# Altium integrated library OMID_DXP_LIB93.IntLib: 684 symbols (part 4 of 5) (continued)
## OPTOCOPLER-4
designator O?, comment OPTO
footprint DIP-16 (DIP; 16 Leads; Row Spacing 7.62 mm; Pitch 2.54 mm)
pins: 1 A "Anode", 2 K "Cathode", 3 A "Anode", 4 K "Cathode", 5 A "Anode", 6 K "Cathode", 7 A "Anode", 8 K "Cathode", 9 E "Emitter", 10 C "Collector", 11 E "Emitter", 12 C "Collector", 13 E "Emitter", 14 C "Collector", 15 E "Emitter", 16 C "Collector"

## Optoisolator
designator U?, comment OPT  (value not drawn)
Optoisolator
footprint My_opto
footprint my_opto_smd
pins: 1 A, 2 K, 3 C, 4 E

## Optoisolator2
designator U?
5 Pin Mini Flat Pack Optocoupler; Published: 24-Mar-1999; LatestRevisionDate: 04-Mar-2005; LatestRevisionNote: PCB Footprint replaced, Sch pins re-numbered.; DatasheetVersion: Apr-2004; PackageReference: SOP5(6); Publisher: Altium Limited
footprint DIP-6 (DIP; 6 Leads; Row Spacing 7.62 mm; Pitch 2.54 mm)
footprint 4N37
pins: 1 A "Anode", 2 K "Cathode", 4 E "Emitter", 5 C "Collector", 6 B "Base"

## PAM8403
designator *
footprint SO-16 (SOIC, 16-Leads, Body 9.9x3.9mm, Pitch 1.27mm, IPC Medium Density)
pins: 1 +L (out), 2 GND (power), 3 -L (out), 4 PWR (power), 5 ~{MUTE} (in), 6 PWR (power), 7 INL (in), 8 Vref (in), 9 GND (power), 10 INR (in), 11 GND (power), 12 ~{SHDN} (in), 13 PWR (power), 14 -R (out), 15 GND (power), 16 +R (out)

## PARS-IR
designator IR?
footprint my_pars
pins: 1 GND, 2 VCC, 3 OUT
text: PARS; +5; Out

## PCA82C250
designator U?
CAN controller interface
footprint My_8S2_M
3D model 8S2 (PCB3D Model)
pins: 1 TXD (in), 2 GND (power), 3 VCC (power), 4 RXD (out), 5 Vref (out), 6 CANL (io), 7 CANH (io), 8 RS (in)

## Peak/Plcae
designator U?, comment Peak Location
peak and place refrence location to place component's; Manufacturer: ---; Class: peak&place; SubClass: smd; Published: 24/08/2015; Publisher: Omid Habibi; Series: assembele
footprint peak&Place
text: Peak/Place Locaion

## PGA2310
designator U?, comment DIGITAL POT
Stereo Audio Volume Control
footprint DIP16
footprint my_smd 16
pins: 1 ZCEN, 2 ~{CS}, 3 SDI, 4 VCC(5) (power), 5 D GND (power), 6 SCLK, 7 SDO, 8 ~{MUTE} (in), 9 VIN R (in), 10 GND R, 11 Vout R (out), 12 A VCC(+15) (power), 13 A GND(-15) (power), 14 Vout L (out), 15 GND L, 16 VIN L (in)

## PIC12F629
designator U?
Flash-Based 8-Bit CMOS Microcontroller, 1K (x14-Bit words) Program Memory, 192 Bytes Data Memory, 8-Pin DFN, Extended Temperature; Published: 29-Jan-2009; DatasheetVersion: revE, Mar-2007; PackageVersion: revAW, Oct-2008; PackageReference: DFN-MD8; Publisher: Altium Limited; PackageDescription: 8-Lead Plastic Dual Flat, No Lead Package (MD) - 4x4x0.9mm Body [DFN]; ComponentLink1Description: Manufacturer Link; ComponentLink1URL: http://www.microchip.com; ComponentLink2Description: Datasheet; ComponentLink2URL: http://ww1.microchip.com/downloads/en/DeviceDoc/41190E.pdf; ComponentLink3Description: Packaging Specification; ComponentLink3URL: http://ww1.microchip.com/downloads/en/PackagingSpec/00049AW.pdf
footprint SO8_NARROW_L (8-Pin Small Outline Package (SO8), IPC High Density)
footprint DIP8
pins: 1 VDD (power), 2 GP5/OSC1/CLKIN (io), 3 GP4/OSC2 (io), 4 GP3/~{MCLR}/VPP (io), 5 GP2/T0CKI (io), 6 GP1/ICSPCLK (io), 7 GP0/ICSPDAT (io), 8 VSS (power)

## PIC16F84A-04/SO
designator U?
Enhanced FLASH/EEPROM 8-Bit Microcontroller, 1K (x14-Bit words) FLASH, 68 Bytes RAM, 4 MHz, 18-Pin SOIC, Standard VDD Range, Commercial Temperature; Note: 25mA source and sink per I/O.; Published: 11-Oct-2004; LatestRevisionDate: 29-Jan-2009; LatestRevisionNote: Sch. layout revised. 3D Model Removed.; DatasheetVersion: revB, Aug-2001; PackageVersion: revAW, Oct-2008; PackageReference: SOIC-SO18; Publisher: Altium Limited; PackageDescription: 18-Lead Plastic Small Outline (SO) - Wide 7.50mm Body [SOIC]; Code_JEDEC: MS-013; ComponentLink1Description: Manufacturer Link; ComponentLink1URL: http://www.microchip.com; ComponentLink2Description: Datasheet; ComponentLink2URL: http://ww1.microchip.com/downloads/en/DeviceDoc/35007b.pdf; ComponentLink3Description: Packaging Specification; ComponentLink3URL: http://ww1.microchip.com/downloads/en/PackagingSpec/00049AW.pdf
footprint SOIC-SO18_N (SOIC, 18-Leads, Body 11.5x7.5mm, Pitch 1.27mm, IPC Medium Density)
footprint SOIC-SO18_L (SOIC, 18-Leads, Body 11.5x7.5mm, Pitch 1.27mm, IPC High Density)
footprint SOIC-SO18_M (SOIC, 18-Leads, Body 11.5x7.5mm, Pitch 1.27mm, IPC Low Density)
pins: 1 RA2 (io), 2 RA3 (io), 3 RA4/T0CKI (io), 4 ~{MCLR} (in), 5 VSS (power), 6 RB0/INT (io), 7 RB1 (io), 8 RB2 (io), 9 RB3 (io), 10 RB4 (io), 11 RB5 (io), 12 RB6 (io), 13 RB7 (io), 14 VDD (power), 15 OSC2/CLKOUT (out), 16 OSC1/CLKIN (in), 17 RA0 (io), 18 RA1 (io)

## PL2303
designator U?
USB to Serial Bridge Controller
footprint SSOP-28
pins: 1 TXD, 2 DTR-N, 3 RTS-N, 4 VDD-232, 5 RXD, 6 RI-N, 7 GND, 8 VDD, 9 DSR-N, 10 DCD-N, 11 CTS-N, 12 SHTD-N, 13 EE-CLK, 14 EE-DATA, 15 DP, 16 DM, 17 VDD-3V3, 18 GND-3V3, 19 RESET, 20 VDD, 21 GND, 22 TRI-MODE, 23 LD-MODE, 24 VDD-PLL, 25 GND-PLL, 26 PLL-TEST, 27 OSC1, 28 OSC2

## PS2501
designator U?, comment OPT  (value not drawn)
Optoisolator
footprint My_opto
footprint my_opto_smd
pins: 1 A, 2 K, 3 E, 4 C

## PT2256 VOLUME DIGITAL
designator U?, comment VOL
Electronic Volume Controller IC(4.5~12V)
footprint DIP-16 (DIP; 16 Leads; Row Spacing 7.62 mm; Pitch 2.54 mm)
pins: 1 GND (power), 2 OUT1, 3 IN1, 4 LT1, 5 AGND, 6 UP (in), 7 DWN (in), 8 OSC, 9 RST, 10 INH, 11 DCO, 12 AGND, 13 LT2, 14 IN2, 15 OUT2, 16 VCC (power)

## RCV420
designator U?
Precision 4mA to 20mA  CURRENT LOOP RECEIVER
footprint DIP-16 (DIP; 16 Leads; Row Spacing 7.62 mm; Pitch 2.54 mm)
pins: 1 -IN, 2 Ct, 3 +IN, 4 V-, 5 REF com, 6 NC, 7 Ref Noise RedU, 8 Ref Trim, 9 NC, 10 REF Fb, 11 REF Out, 12 REF In, 13 Rcv Com, 14 Rcv Out, 15 Rcv Fb, 16 V+

## REF02AZ
designator U?  (value not drawn)
+5V Precision Voltage Reference/Temperature Transducer; Note: Pins 1, 7 and 8 are not connected; Pin 4 is connected to case; Published: 8-Jun-2000; LatestRevisionDate: 29-May-2009; LatestRevisionNote: Component Body Added.; DatasheetVersion: REV. B 1992; PackageVersion: 1998; PackageReference: Q-8; Publisher: Altium Limited; PackageDescription: DIP, 8-Pin, Row Spacing 7.62 mm, Pitch 2.54 mm; ComponentLink1Description: Manufacturer Link; ComponentLink1URL: http://www.analog.com/en/prod/0%2C2877%2CREF02%2C00.html; ComponentLink2Description: Datasheet; ComponentLink2URL: http://www.analog.com/UploadedFiles/Data_Sheets/499818767ref02_h.pdf
footprint Q-8 (DIP, 8-Leads, Row Spacing 7.62mm, Pitch 2.54mm, Body 9.91x6.73mm)
3D model Q-8 (PCB3D Model)
simulation model REF02A (SUBCKT)
pins: 1 NC, 2 IN (power), 3 TEMP, 4 GND (power), 5 TRIM, 6 OUT (power), 7 NC, 8 NC

## REF3333
designator U?
3.9µA, SOT23 30ppm/°C Drift  VOLTAGE REFERENCE
footprint SOT23_L (SOT23, 3-Leads, Body 2.9x1.3mm, Pitch 0.95mm, Lead Span 2.3mm, IPC High Density)
footprint SOT23_M (SOT23, 3-Leads, Body 2.9x1.3mm, Pitch 0.95mm, Lead Span 2.3mm, IPC Low Density)
footprint SOT23_N (SOT23, 3-Leads, Body 2.9x1.3mm, Pitch 0.95mm, Lead Span 2.3mm, IPC Medium Density)
pins: 1 IN (power), 2 OUT (power), 3 GND

## RF01D
designator RF?
READER RFID MODULE
footprint MY_rf01d
pins: 1 vcc, 2 CLK, 3 TX, 4 CP, 5 NC, 6 SW2, 7 SW3, 8 NC, 9 LED, 10 GND, 11, 12
text: ANT

## RFID RC013
designator IC?, comment CR013
READ AND WRITE RFID MODULE
footprint CR0 13
pins: 1 VCC (in), 2 GND (in), 3 LED1 (out), 4 TX2 (oc), 5 TX1 (oc), 6 RX (oc), 7 GND (oc), 8 LED2 (out), 9 TXD (oc), 10 RXD (oc)
text: RFID CR013

## RFID YLMF18
designator RFID?, comment RFID
READ AND WRITE RFID MODULE
footprint YLMF18
pins: 3 VCC (in), 4 GND (in), 5 RXD (in), 6 TXD (out), 7 VCC (in)

## RFM12
designator RF?  (value not drawn)
Universal ISM Band FSK Transceiver Module
footprint RFM12SMD
footprint RFM12
pins: 1 VDI, 2 SDI, 3 nSEL, 4 nIRQ, 5 DCLK, 6 nRES, 7 GND (in), 8 CLK (in), 9 FSK (in), 10 SDO (in), 11 SCK (in), 12 VDD (in)

## RFM12BP
designator RFM12BP?
footprint RFM12BP
pins: 1 GND, 2 GND, 3 PWR 12V, 4 GND, 5 SDI, 6 SCK, 7 nSEL, 8 SDO, 9 nIRQ, 10 FSK, 11 FIT, 12 CLK, 13 ANT, 14 GND, 15 GND, 16 RXEN, 17 GND, 18 TXEN, 19 GND, 20 3.3 V, 21 GND, 22 nINT, 23 GND, 24 nRES

## RTL8201BL
designator U?
SINGLE PORT 10/100M  FAST ETHERNET PHYCEIVER
footprint MY_LQFP48 (TSQFP, 48-Leads, Body 9.0x9.0mm (max), Pitch 0.50mm, IPC Medium Density)
3D model AT90C8534-48A (PCB3D Model)
pins: 1 COL (out), 2 TXEN (in), 3 TXD3 (in), 4 TXD2 (in), 5 TXD1 (in), 6 TXD0 (in), 7 TXC (out), 8 PWFBIN (in), 9 LED0/AD0 (out), 10 LED1/AD1 (out), 11 DGND (power), 12 LED2/AD2 (out), 13 LED3/AD3 (out), 14 DVDD33 (power), 15 LED4/AD4 (out), 16 RXC (out), 17 DGND (power), 18 RXD3 (out), 19 RXD2 (out), 20 RXD1 (out), 21 RXD0 (out), 22 RXDV (out), 23 CRS (out), 24 RXER/FXEN (out), 25 MDC (in), 26 MDIO (io), 27 NC (power), 28 RTSET (in), 29 AGND (power), 30 TPRX- (in), 31 TPRX+ (in), 32 PWFBOUT (in), 33 TPTX- (out), 34 TPTX+ (out), 35 AGND (power), 36 AVDD33 (power), 37 ANE (power), 38 DUPLEX (power), 39 SPEED (power), 40 RPTR (in), 41 LDPS (in), 42 RESETB (in), 43 ISOLATE (in), 44 MII/SNIB/RTT3 (io), 45 DGND (power), 46 X1, 47 X2, 48 DVDD33 (power)

## SC43L22
designator U?
Low Power, Stereo DAC w/Headphone & Speaker Amps; by: Omid habibi; make:: 18/3/4
footprint QFN40 (QFN, 40-Leads, Body 6x6mm, No Lead,)
pins: 1 SDA, 2 SCL, 3 A0, 4 SPKR_OUTA+ (out), 5 VP, 6 SPKR_OUTA- (out), 7 SPKR_OUTB+ (out), 8 VP, 9 SPKR_OUTB- (out), 10 -VHPFILT, 11 FLYN, 12 FLYP, 13 +VHP, 14 HP /LINE_OUTB (out), 15 HP /LINE_OUTA (out), 16 VA, 17 AGND, 18 FILT+, 19 VQ, 20 TSTO, 21 AIN4A (in), 22 AIN4B (in), 23 AIN3A (in), 24 AIN3B (in), 25 AIN2A (in), 26 AIN2B (in), 27 AFILTA, 28 AFILTB, 29 AIN1A (in), 30 AIN1B (in), 31 SPKR/HP, 32 ~{RESET}, 33 VL (power), 34 VD, 35 DGND (power), 36 TSTO, 37 MCLK, 38 SCLK, 39 SDIN, 40 LRCK

## SHT1X
designator U?  (value not drawn)
Photo Modules for PCM Remote Control Systems; Designer: Omid Habibi; Company: SensIron; Voltage: 2.4v~5.5V; Power: 3 mW; Adding Date: 1394/09/26
footprint SHT1X
pins: 1 GND (power), 2 Data (io), 3 sck (in), 4 2.4~5.5(3.3) (power)

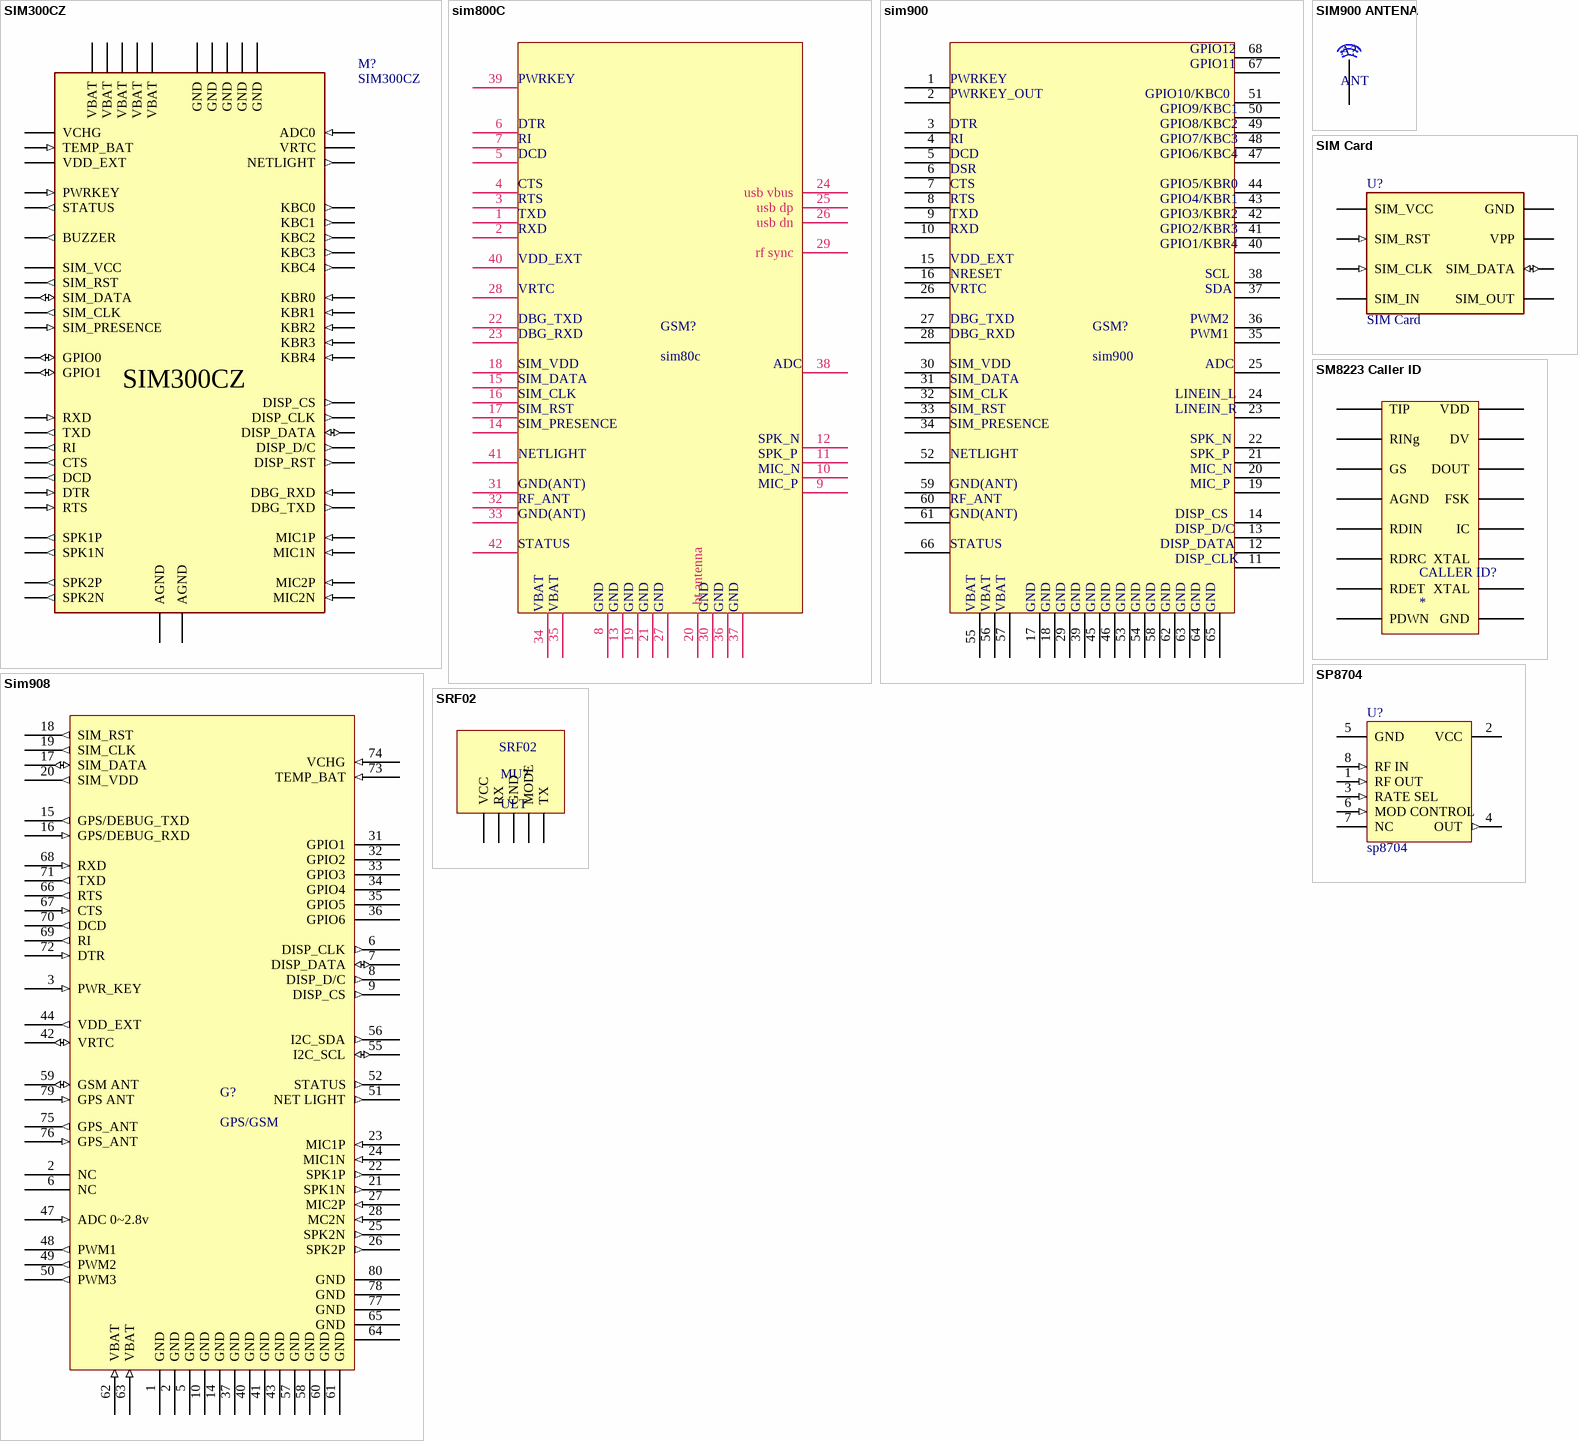
[diagram p24: symbols SIM300CZ to SRF02]

## SIM300CZ
designator M?
footprint MY_SIM300
pins: 1 VBAT (power), 2 GND (power), 3 VBAT (power), 4 GND (power), 5 VBAT (power), 6 GND (power), 7 VBAT (power), 8 GND (power), 9 VBAT (power), 10 GND (power), 11 VCHG (power), 12 ADC0 (in), 13 TEMP_BAT (in), 14 VRTC, 15 VDD_EXT, 16 NETLIGHT (out), 17 PWRKEY (in), 18 KBC0 (out), 19 STATUS (out), 20 KBC1 (out), 21 GPIO0 (io), 22 KBC2 (out), 23 BUZZER (out), 24 KBC3 (out), 25 SIM_VCC (power), 26 KBC4 (out), 27 SIM_RST (out), 28 KBR0 (in), 29 SIM_DATA (io), 30 KBR1 (in), 31 SIM_CLK (out), 32 KBR2 (in), 33 SIM_PRESENCE (in), 34 KBR3 (in), 35 GPIO1 (io), 36 KBR4 (in), 37 DCD (out), 38 DISP_CS (out), 39 DTR (in), 40 DISP_CLK (out), 41 RXD (in), 42 DISP_DATA (io), 43 TXD (out), 44 DISP_D/C (out), 45 RTS (in), 46 DISP_RST (out), 47 CTS (out), 48 DBG_RXD (in), 49 RI (out), 50 DBG_TXD (out), 51 AGND (power), 52 AGND (power), 53 SPK1P (out), 54 MIC1P (in), 55 SPK1N (out), 56 MIC1N (in), 57 SPK2P (out), 58 MIC2P (in), 59 SPK2N (out), 60 MIC2N (in)

## sim800C
designator GSM?, comment sim80c
GSM GPRS MODULE
footprint sim800C
pins: 1, 2, 3, 4, 5, 6, 7, 8, 9, 10, 11, 12, 13, 14, 15, 16, 17, 18, 19, 20 bt antenna, 21, 22, 23, 24 usb vbus, 25 usb dp, 26 usb dn, 27, 28, 29 rf sync, 30, 31, 32, 33, 34, 35, 36, 37, 38, 39, 40, 41, 42
text: PWRKEY; DTR; RI; DCD; CTS; RTS; TXD; RXD; VDD_EXT; VRTC; DBG_TXD; DBG_RXD; SIM_VDD; ADC; SIM_DATA; SIM_CLK; SIM_RST; SIM_PRESENCE; SPK_N; NETLIGHT; SPK_P; MIC_N; GND(ANT); MIC_P; RF_ANT; STATUS; VBAT; GND

## sim900
designator GSM?
GSM GPRS MODULE
footprint sim900
pins: 1, 2, 3, 4, 5, 6, 7, 8, 9, 10, 11, 12, 13, 14, 15, 16, 17, 18, 19, 20, 21, 22, 23, 24, 25, 26, 27, 28, 29, 30, 31, 32, 33, 34, 35, 36, 37, 38, 39, 40, 41, 42, 43, 44, 45, 46, 47, 48, 49, 50, 51, 52, 53, 54, 55, 56, 57, 58, 59, 60, 61, 62, 63, 64, 65, 66, 67, 68
text: GPIO12; GPIO11; PWRKEY; PWRKEY_OUT; GPIO10/KBC0; GPIO9/KBC1; DTR; GPIO8/KBC2; RI; GPIO7/KBC3; DCD; GPIO6/KBC4; DSR; CTS; GPIO5/KBR0; RTS; GPIO4/KBR1; TXD; GPIO3/KBR2; RXD; GPIO2/KBR3; GPIO1/KBR4; VDD_EXT; NRESET; SCL; VRTC; SDA; DBG_TXD; PWM2; DBG_RXD; PWM1; SIM_VDD; ADC; SIM_DATA; SIM_CLK; LINEIN_L; SIM_RST; LINEIN_R; SIM_PRESENCE; SPK_N; NETLIGHT; SPK_P; MIC_N; GND(ANT); MIC_P; RF_ANT; DISP_CS; DISP_D/C; STATUS; DISP_DATA; DISP_CLK; VBAT; GND

## SIM900 ANTENA
designator A?, comment ANT
SIM900 ANTENA ON PCB
footprint sim900 antena
pins: 0

## Sim908
designator G?, comment GPS/GSM
GPS GSM MODULE
footprint sim908
pins: 1 GND, 2 NC, 2 GND, 3 PWR_KEY (in), 5 GND, 6 NC, 6 DISP_CLK (out), 7 DISP_DATA (io), 8 DISP_D/C (out), 9 DISP_CS (out), 10 GND, 14 GND, 15 GPS/DEBUG_TXD (out), 16 GPS/DEBUG_RXD (in), 17 SIM_DATA (io), 18 SIM_RST (out), 19 SIM_CLK (out), 20 SIM_VDD (out), 21 SPK1N (out), 22 SPK1P (out), 23 MIC1P (in), 24 MIC1N (in), 25 SPK2N (out), 26 SPK2P (out), 27 MIC2P (in), 28 MC2N (in), 31 GPIO1 (oc), 32 GPIO2, 33 GPIO3, 34 GPIO4, 35 GPIO5, 36 GPIO6, 37 GND, 40 GND, 41 GND, 42 VRTC (io), 43 GND, 44 VDD_EXT (out), 47 ADC 0~2.8v (in), 48 PWM1 (out), 49 PWM2 (out), 50 PWM3 (out), 51 NET LIGHT (out), 52 STATUS (out), 55 I2C_SCL (io), 56 I2C_SDA (out), 57 GND, 58 GND, 59 GSM ANT (io), 60 GND, 61 GND, 62 VBAT (in), 63 VBAT (in), 64 GND, 65 GND, 66 RTS (out), 67 CTS (in), 68 RXD (in), 69 RI (out), 70 DCD (out), 71 TXD (out), 72 DTR (in), 73 TEMP_BAT (in), 74 VCHG (in), 75 GPS_ANT (out), 76 GPS_ANT (in), 77 GND, 78 GND, 79 GPS ANT (in), 80 GND

## SIM Card
designator U?
footprint MY_SIMCARD
footprint MY_SIMCARD - mini
pins: C1 SIM_VCC (power), C2 SIM_RST (in), C3 SIM_CLK (in), C4 SIM_IN, C5 GND (power), C6 VPP, C7 SIM_DATA (io), C8 SIM_OUT

## SM8223 Caller ID
designator CALLER ID?
CALLER ID AND DTMF DETECTOR
footprint My_DIP-16
pins: 1 TIP, 2 RINg, 3 GS, 4 AGND, 5 RDIN, 6 RDRC, 7 RDET, 8 PDWN, 9 GND, 10 XTAL, 11 XTAL, 12 IC, 13 FSK, 14 DOUT, 15 DV, 16 VDD

## SP8704
designator U?, comment sp8704
The SP8704 is a switchable divide by 128/129, 64/65 programmable divider with a maximum specified operating frequency of 950MHz.; Manufacturer: ST-Microelectronics; Class: Memory; SubClass: EEPROM; Published: 24/08/2001; Publisher: Altium Hobart Technology Centre; Series: Serial
footprint My_DIP8
3D model 8p3 (PCB3D Model)
footprint SOIC127P600-8M (SOIC, 8-Leads, Body 4.9x3.9mm, Pitch 1.27mm, IPC Low Density)
footprint SOIC127P600-8L (SOIC, 8-Leads, Body 4.9x3.9mm, Pitch 1.27mm, IPC High Density)
pins: 1 RF OUT (in), 2 VCC (power), 3 RATE SEL (in), 4 OUT (out), 5 GND (power), 6 MOD CONTROL (in), 7 NC, 8 RF IN (in)

## SRF02
designator MU?, comment ULT
5 VOLT VOLTAGE REFTRENCE
footprint my_srf02
pins: 1 GND, 2 MODE, 3 TX, 4 RX, 5 VCC

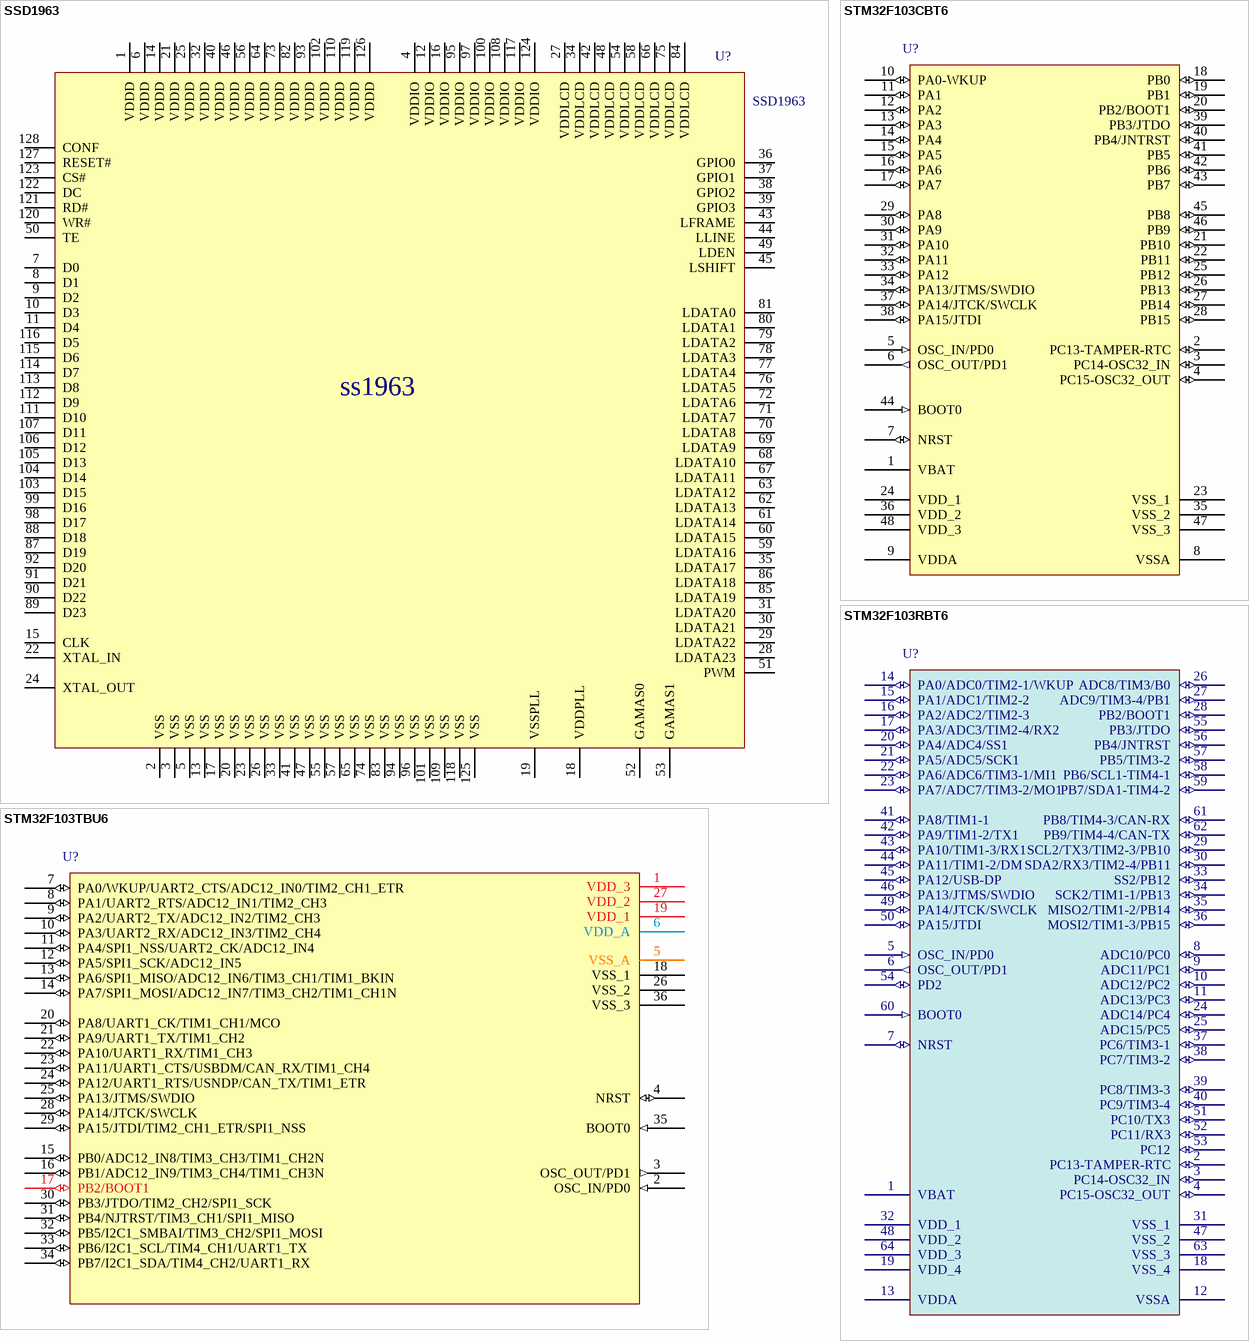
[diagram p25: symbols SSD1963 to STM32F103TBU6]

## SSD1963
designator U?
LCD COLOR DRIVER
footprint LQFP128
pins: 1 VDDD, 2 VSS, 3 VSS, 4 VDDIO, 5 VSS, 6 VDDD, 7 D0, 8 D1, 9 D2, 10 D3, 11 D4, 12 VDDIO, 13 VSS, 14 VDDD, 15 CLK, 16 VDDIO, 17 VSS, 18 VDDPLL, 19 VSSPLL, 20 VSS, 21 VDDD, 22 XTAL_IN, 23 VSS, 24 XTAL_OUT, 25 VDDD, 26 VSS, 27 VDDLCD, 28 LDATA23, 29 LDATA22, 30 LDATA21, 31 LDATA20, 32 VDDD, 33 VSS, 34 VDDLCD, 35 LDATA17, 36 GPIO0, 37 GPIO1, 38 GPIO2, 39 GPIO3, 40 VDDD, 41 VSS, 42 VDDLCD, 43 LFRAME, 44 LLINE, 45 LSHIFT, 46 VDDD, 47 VSS, 48 VDDLCD, 49 LDEN, 50 TE, 51 PWM, 52 GAMAS0, 53 GAMAS1, 54 VDDLCD, 55 VSS, 56 VDDD, 57 VSS, 58 VDDLCD, 59 LDATA16, 60 LDATA15, 61 LDATA14, 62 LDATA13, 63 LDATA12, 64 VDDD, 65 VSS, 66 VDDLCD, 67 LDATA11, 68 LDATA10, 69 LDATA9, 70 LDATA8, 71 LDATA7, 72 LDATA6, 73 VDDD, 74 VSS, 75 VDDLCD, 76 LDATA5, 77 LDATA4, 78 LDATA3, 79 LDATA2, 80 LDATA1, 81 LDATA0, 82 VDDD, 83 VSS, 84 VDDLCD, 85 LDATA19, 86 LDATA18, 87 D19, 88 D18, 89 D23, 90 D22, 91 D21, 92 D20, 93 VDDD, 94 VSS, 95 VDDIO, 96 VSS, 97 VDDIO, 98 D17, 99 D16, 100 VDDIO, 101 VSS, 102 VDDD, 103 D15, 104 D14, 105 D13, 106 D12, 107 D11, 108 VDDIO, 109 VSS, 110 VDDD, 111 D10, 112 D9, 113 D8, 114 D7, 115 D6, 116 D5, 117 VDDIO, 118 VSS, 119 VDDD, 120 WR#, 121 RD#, 122 DC, 123 CS#, 124 VDDIO, 125 VSS, 126 VDDD, 127 RESET#, 128 CONF
text: ss1963

## STM32F103CBT6
designator U?
STM32 ARM-based 32-bit MCU with 128 Kbytes Flash, 48-pin LQFP, Industrial Temperature; Published: 30-May-2008; DatasheetVersion: rev6, Mar-2008; PackageVersion: Mar-2008; PackageReference: LQFP48; Publisher: Altium Limited; PackageDescription: 48-Pin Low-Profile Quad Flat Pack, 7 x 7 mm Body, 0.5 mm Pitch (LQFP48); ComponentLink1Description: Manufacturer Link; ComponentLink1URL: www.st.com/stm32; ComponentLink2Description: Datasheet; ComponentLink2URL: http://www.st.com/stonline/products/literature/ds/13587.pdf
footprint LQFP48_N (Thin QFP, 48-Leads, Body 7x7mm, Pitch 0.5mm, IPC Medium Density)
footprint LQFP48_L (Thin QFP, 48-Leads, Body 7x7mm, Pitch 0.5mm, IPC High Density)
footprint LQFP48_M (Thin QFP, 48-Leads, Body 7x7mm, Pitch 0.5mm, IPC Low Density)
pins: 1 VBAT (power), 2 PC13-TAMPER-RTC (io), 3 PC14-OSC32_IN (io), 4 PC15-OSC32_OUT (io), 5 OSC_IN/PD0 (in), 6 OSC_OUT/PD1 (out), 7 NRST (io), 8 VSSA (power), 9 VDDA (power), 10 PA0-WKUP (io), 11 PA1 (io), 12 PA2 (io), 13 PA3 (io), 14 PA4 (io), 15 PA5 (io), 16 PA6 (io), 17 PA7 (io), 18 PB0 (io), 19 PB1 (io), 20 PB2/BOOT1 (io), 21 PB10 (io), 22 PB11 (io), 23 VSS_1 (power), 24 VDD_1 (power), 25 PB12 (io), 26 PB13 (io), 27 PB14 (io), 28 PB15 (io), 29 PA8 (io), 30 PA9 (io), 31 PA10 (io), 32 PA11 (io), 33 PA12 (io), 34 PA13/JTMS/SWDIO (io), 35 VSS_2 (power), 36 VDD_2 (power), 37 PA14/JTCK/SWCLK (io), 38 PA15/JTDI (io), 39 PB3/JTDO (io), 40 PB4/JNTRST (io), 41 PB5 (io), 42 PB6 (io), 43 PB7 (io), 44 BOOT0 (in), 45 PB8 (io), 46 PB9 (io), 47 VSS_3 (power), 48 VDD_3 (power)